# Altium footprint library Connectors.PcbLib: 67 footprints (part 5 of 5)
Each footprint in its own frame and in the unit in brackets; x right, y up, seen from the top. Pads: shape width x height; smd on the part's side, far side on the other; paste and mask are expansions set on the pad; w line width, h text height; cw(c..) or ccw(c..) is an arc to the next point about the centre after c.
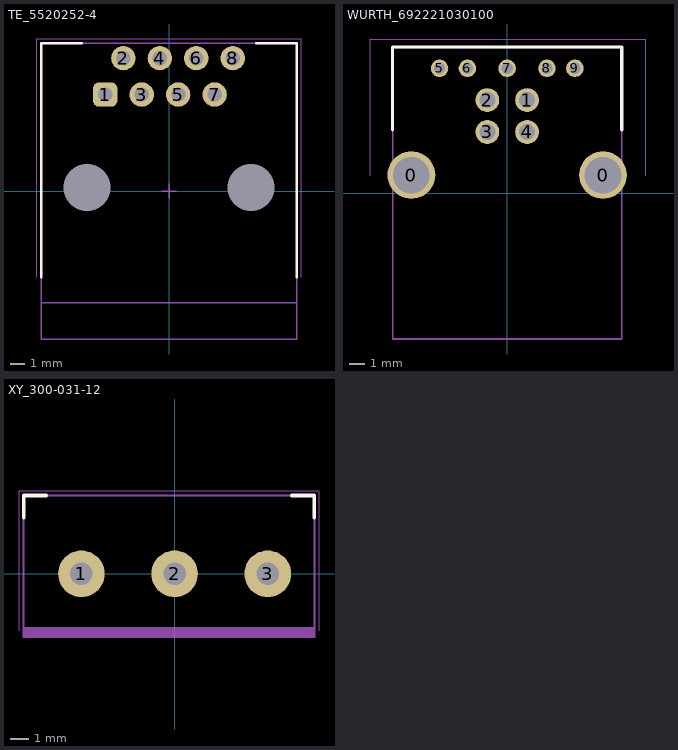
[diagram p4: the footprints below, top view; thin cyan lines are the x and y axes]

## TE_5520252-4 [mm]
height 16
pads (10):
  rrect50% 1.7x1.7 hole 1: 1(-4.445,6.731)
  round 1.7 hole 1: 2(-3.175,9.271) 3(-1.905,6.731) 4(-0.635,9.271) 5(0.635,6.731) 6(1.905,9.271) 7(3.175,6.731) 8(4.445,9.271)
  round 0 hole 3.25 unplated: MH(-5.715,0.254) MH(5.715,0.254)
Top Overlay:
  lines w0.2: -8.9,-6 -8.9,10.3 -6.1,10.3 ; 6.1,10.3 8.9,10.3 8.9,-6
Board:
  lines w0.1: -8.9,-7.775 8.9,-7.775
Top Assembly:
  lines w0.1: -8.9,-10.3 8.9,-10.3 8.9,10.3 -8.9,10.3 -8.9,-10.3
  text ".Designator" at -5.835,-0.571 h1.6
Top Courtyard (Mech13):
  lines w0.05: -9.2,-6 -9.2,10.6 9.2,10.6 9.2,-6
  lines w0.1: -0.5,0 0.5,0 ; 0,-0.5 0,0.5
3D body "c-5520252.step": height 16.13, standoff -4.19, extent -8.89,-10.287 8.89,10.287

## WURTH_692221030100 [mm]
height 12.21
pads (11):
  round 3 hole 2.3 mask+0.05: 0(-6.02,1.15) 0(6.02,1.15)
  round 1.5 hole 1 mask+0.05: 1(1.25,5.86) 2(-1.25,5.86) 3(-1.25,3.86) 4(1.25,3.86)
  round 1.1 hole 0.7 mask+0.05: 5(-4.25,7.86) 6(-2.5,7.86) 7(0,7.86) 8(2.5,7.86) 9(4.25,7.86)
Top Overlay:
  lines w0.2: -7.2,4 -7.2,9.2 7.2,9.2 7.2,4
Top Assembly:
  lines w0.1: -7.2,-9.15 -7.2,9.15 7.2,9.15 7.2,-9.15 -7.2,-9.15
  text ".Designator" at -5.835,-0.571 h1.6
Top Courtyard (Mech13):
  lines w0.05: -8.6,1.1 -8.6,9.7 8.7,9.7 8.7,1.1
3D body "692221030100.stp": height 13.3, standoff -2.26, extent -7.2,-9.15 7.199,9.15

## XY_300-031-12 [mm]
height 12.5
pads (3):
  round 2.5 hole 1.2 mask+0.05: 1(-5,0) 2(0,0) 3(5,0)
Top Overlay:
  lines w0.2: -8.1,3 -8.1,4.2 -6.9,4.2 ; 6.3,4.2 7.5,4.2 7.5,3
Board:
  lines w0.1: -8.1,-3.4 7.5,-3.4
Top Assembly:
  region: -8.1,-2.9 -8.1,-3.4 7.5,-3.4 7.5,-2.9
  lines w0.1: -8.1,-2.9 7.5,-2.9 ; -8.1,-3.4 7.5,-3.4 7.5,4.2 -8.1,4.2 -8.1,-3.4
  text ".Designator" at -5.835,-0.571 h1.6
Top Courtyard (Mech13):
  lines w0.05: -8.35,-3.05 -8.35,4.45 7.75,4.45 7.75,-3.05
  lines w0.1: -0.5,0 0.5,0 ; 0,-0.5 0,0.5
3D body "DG301-5_0-3P12.STEP": height 10, standoff -4.16, extent -8.1,-3.4 7.5,4.2